# Altium footprint library Connectors.PcbLib: 131 footprints (part 5 of 9)
Each footprint in its own frame and in the unit in brackets; x right, y up, seen from the top. Pads: shape width x height; smd on the part's side, far side on the other; paste and mask are expansions set on the pad; w line width, h text height; cw(c..) or ccw(c..) is an arc to the next point about the centre after c.
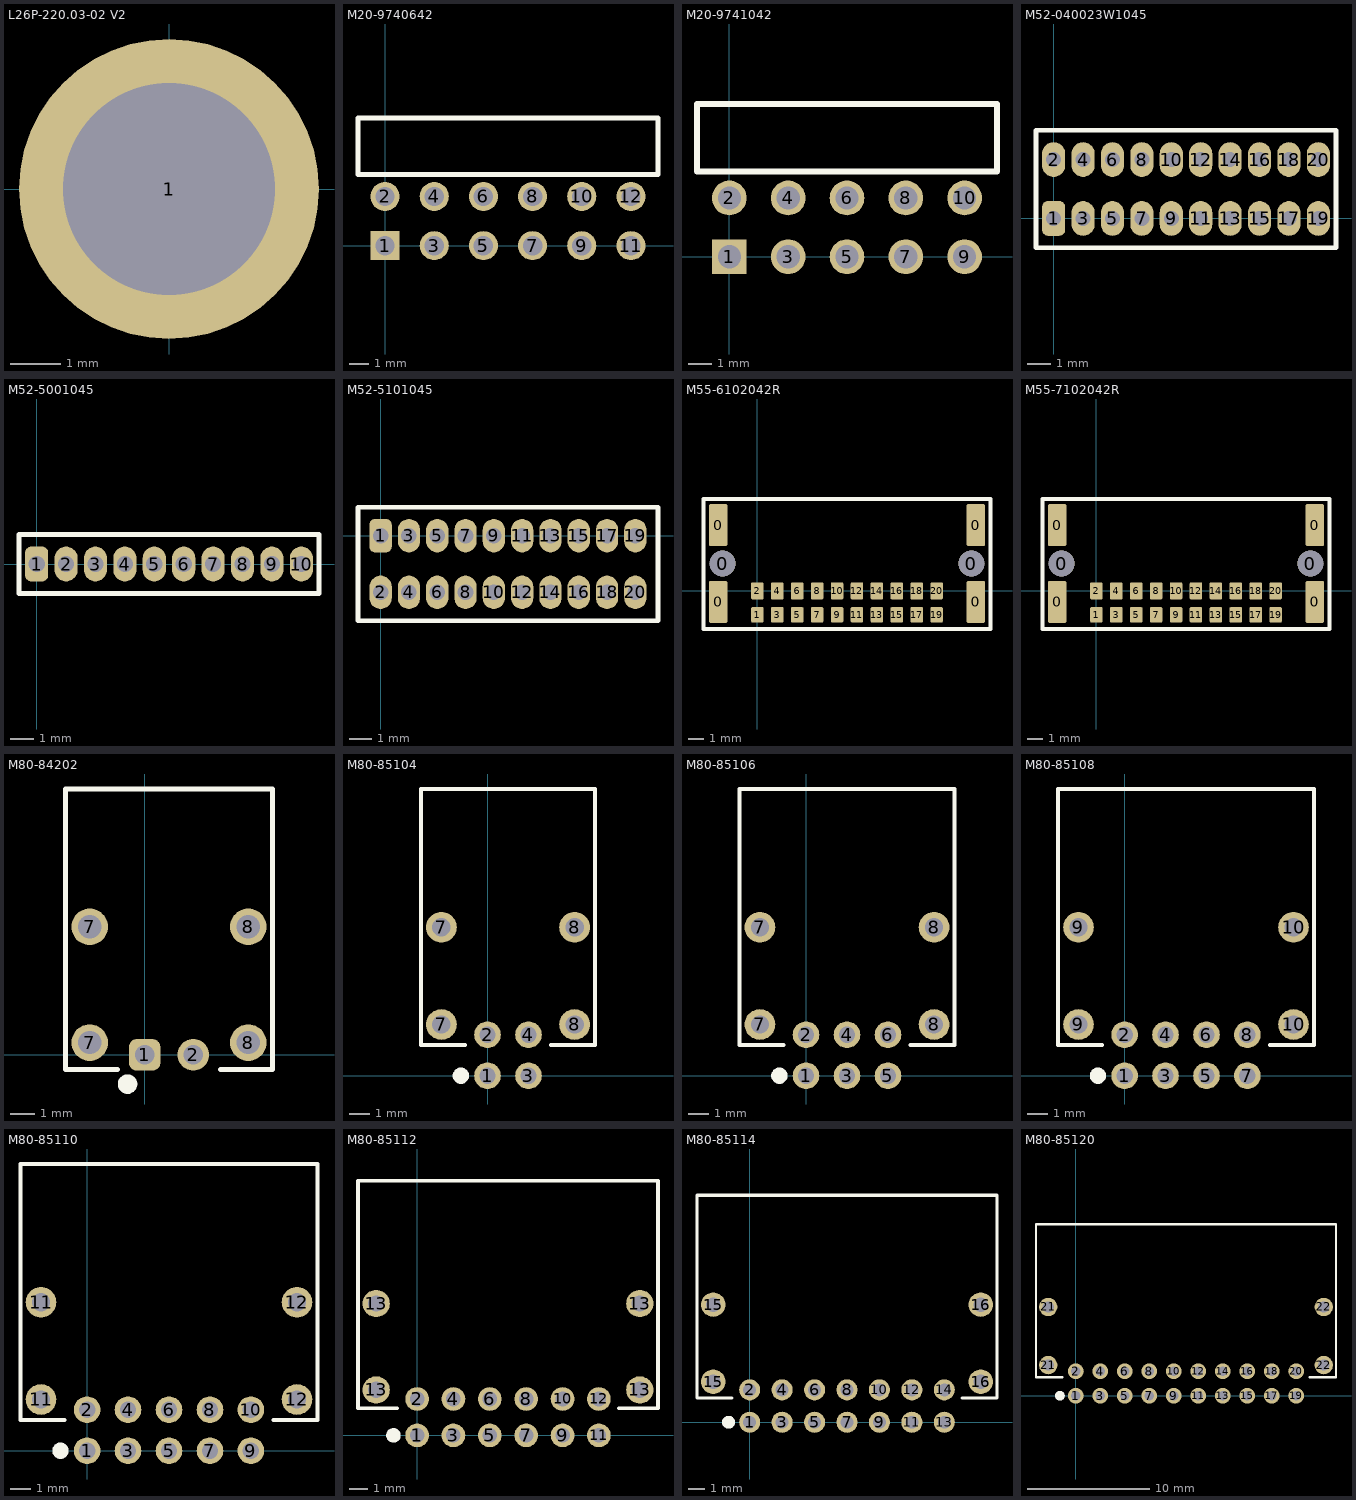
[diagram p4: the footprints below, top view; thin cyan lines are the x and y axes]

## L26P-220.03-02 V2 [mm]
pads (1):
  round 6 hole 4.25: 1(0,0)
Top Assembly:
  text ".Designator" at -4.998,-0.333 h1
3D body "L26P-220.03-02.STEP": height 3.7, standoff -1.3, extent -3,-3 3,3

## M20-9740642 [mm]
pads (12):
  rect 1.5x1.5 hole 1: 1(0,0)
  round 1.5 hole 1: 2(0,2.54) 3(2.54,0) 4(2.54,2.54) 5(5.08,0) 6(5.08,2.54) 7(7.62,0) 8(7.62,2.54) 9(10.16,0) 10(10.16,2.54) 11(12.7,0) 12(12.7,2.54)
Top Overlay:
  lines w0.254: -1.397,3.683 -1.397,6.604 14.097,6.604 14.097,3.683 -1.397,3.683
Top Assembly:
  text ".Designator" at 1.302,4.767 h1
3D body "m20-9740642_asm.stp": height 5.04, standoff -3, extent -1.275,-0.325 13.965,12.235

## M20-9741042 [mm]
pads (10):
  rect 1.5x1.5 hole 1: 1(0,0)
  round 1.5 hole 1: 2(0,2.54) 3(2.54,0) 4(2.54,2.54) 5(5.08,0) 6(5.08,2.54) 7(7.62,0) 8(7.62,2.54) 9(10.16,0) 10(10.16,2.54)
Top Overlay:
  lines w0.254: -1.397,3.683 11.557,3.683 11.557,6.604 -1.397,6.604 -1.397,3.683
Top Assembly:
  text ".Designator" at 0.102,4.867 h1
3D body "m20-9740542_asm.stp": height 5.04, standoff -3, extent -1.275,-0.325 11.425,12.235

## M52-040023W1045 [mm]
pads (20):
  rrect50% 1x1.5 hole 0.65: 1(0,0)
  oval 1x1.5 hole 0.65: 2(0,2.54) 3(1.27,0) 4(1.27,2.54) 5(2.54,0) 6(2.54,2.54) 7(3.81,0) 8(3.81,2.54) 9(5.08,0) 10(5.08,2.54) 11(6.35,0) 12(6.35,2.54) 13(7.62,0) 14(7.62,2.54) 15(8.89,0) 16(8.89,2.54) 17(10.16,0) 18(10.16,2.54) 19(11.43,0) 20(11.43,2.54)
Top Overlay:
  lines w0.203: -0.762,-1.27 -0.762,3.81 12.192,3.81 12.192,-1.27 -0.762,-1.27
Top Assembly:
  text ".Designator" at 0.702,0.967 h1
3D body "m52-040023w1045_asm.stp": height 6.54, standoff -2.26, extent -0.635,-1.25 12.065,3.75

## M52-5001045 [mm]
pads (10):
  rrect50% 1x1.5 hole 0.7: 1(0,0)
  oval 1x1.5 hole 0.7: 2(1.27,0) 3(2.54,0) 4(3.81,0) 5(5.08,0) 6(6.35,0) 7(7.62,0) 8(8.89,0) 9(10.16,0) 10(11.43,0)
Top Overlay:
  lines w0.203: -0.762,-1.27 12.192,-1.27 12.192,1.27 -0.762,1.27 -0.762,-1.27
Top Assembly:
  text ".Designator" at 0.702,-0.333 h1
3D body "m52-5001045_asm.stp": height 4.64, standoff -2.96, extent -0.635,-1.2 12.065,1.2

## M52-5101045 [mm]
pads (20):
  rrect50% 1x1.5 hole 0.7: 1(0,0)
  oval 1x1.5 hole 0.7: 2(0,-2.54) 3(1.27,0) 4(1.27,-2.54) 5(2.54,0) 6(2.54,-2.54) 7(3.81,0) 8(3.81,-2.54) 9(5.08,0) 10(5.08,-2.54) 11(6.35,0) 12(6.35,-2.54) 13(7.62,0) 14(7.62,-2.54) 15(8.89,0) 16(8.89,-2.54) 17(10.16,0) 18(10.16,-2.54) 19(11.43,0) 20(11.43,-2.54)
Top Overlay:
  lines w0.203: -1.016,-3.81 -1.016,1.27 12.446,1.27 12.446,-3.81 -1.016,-3.81
Top Assembly:
  text ".Designator" at 0.702,-1.633 h1
3D body "m52-5101045_asm.stp": height 4.64, standoff -2.96, extent -0.835,-3.77 12.265,1.23

## M55-6102042R [mm]
pads (26):
  rrect25% 1.2x2.7 smd: 0(-2.495,-0.704) 0(-2.495,4.196) 0(13.925,-0.704) 0(13.925,4.196)
  round 1.65 hole 1.65 unplated: 0(-2.21,1.746) 0(13.64,1.746)
  rrect25% 0.8x1 smd: 1(0,-1.524) 3(1.27,-1.524) 5(2.54,-1.524) 7(3.81,-1.524) 9(5.08,-1.524) 11(6.35,-1.524) 13(7.62,-1.524) 15(8.89,-1.524) 17(10.16,-1.524) 19(11.43,-1.524)
  rrect25% 0.8x1.1 smd: 2(0,0) 4(1.27,0) 6(2.54,0) 8(3.81,0) 10(5.08,0) 12(6.35,0) 14(7.62,0) 16(8.89,0) 18(10.16,0) 20(11.43,0)
Top Overlay:
  lines w0.254: -3.429,-2.413 -3.429,5.842 14.859,5.842 14.859,-2.413 -3.429,-2.413
Top Assembly:
  text ".Designator" at 0.702,2.367 h1
3D body "m55-6102042_asm.stp": height 3.74, standoff -0.69, extent -3.175,-1.854 14.605,8.946

## M55-7102042R [mm]
pads (26):
  rrect25% 1.2x2.7 smd: 0(-2.495,-0.704) 0(-2.495,4.196) 0(13.925,-0.704) 0(13.925,4.196)
  round 1.65 hole 1.65 unplated: 0(-2.21,1.746) 0(13.64,1.746)
  rrect25% 0.8x1 smd: 1(0,-1.524) 3(1.27,-1.524) 5(2.54,-1.524) 7(3.81,-1.524) 9(5.08,-1.524) 11(6.35,-1.524) 13(7.62,-1.524) 15(8.89,-1.524) 17(10.16,-1.524) 19(11.43,-1.524)
  rrect25% 0.8x1.1 smd: 2(0,0) 4(1.27,0) 6(2.54,0) 8(3.81,0) 10(5.08,0) 12(6.35,0) 14(7.62,0) 16(8.89,0) 18(10.16,0) 20(11.43,0)
Top Overlay:
  lines w0.254: -3.429,-2.413 14.859,-2.413 14.859,5.842 -3.429,5.842 -3.429,-2.413
Top Assembly:
  text ".Designator" at 0.702,2.567 h1
3D body "m55-7102042_asm.stp": height 4.25, standoff -0.7, extent -3.175,-1.85 14.605,8.15

## M80-84202 [mm]
pads (6):
  rrect50% 1.3x1.3 hole 0.8: 1(0,0)
  round 1.3 hole 0.8: 2(2,0)
  round 1.5 hole 0.95: 7(-2.25,0.5) 7(-2.25,5.25) 8(4.25,0.5) 8(4.25,5.25)
Top Overlay:
  circle w0.4: c-0.7,-1.2 r0.2
  lines w0.2: -1.1,-0.6 -3.25,-0.6 -3.25,10.9 5.25,10.9 5.25,-0.6 3.1,-0.6
Top Assembly:
  text ".Designator" at -3.998,2.192 h1
3D body "M80-8450245.stp": height 3.8, standoff 0.4, extent -2.5,2.95 4.5,10.6
3D body "M80-8420245.stp": height 3.88, standoff -2.97, extent -2.95,-0.1 4.95,9

## M80-85104 [mm]
pads (8):
  round 1.3 hole 0.8: 1(0,0) 2(0,2) 3(2,0) 4(2,2)
  round 1.5 hole 0.9: 7(-2.25,2.5) 7(-2.25,7.25) 8(4.25,2.5) 8(4.25,7.25)
Top Overlay:
  circle w0.4: c-1.3,0 r0.2
  lines w0.2: -1.1,1.5 -3.25,1.5 -3.25,14 5.25,14 5.25,1.5 3.1,1.5
Top Assembly:
  text ".Designator" at -3.998,4.467 h1
3D body "m80-8510442_asm.stp": height 5.87, standoff -3.17, extent -2.95,-0.275 4.95,10.825

## M80-85106 [mm]
pads (10):
  round 1.3 hole 0.8: 1(0,0) 2(0,2) 3(2,0) 4(2,2) 5(4,0) 6(4,2)
  round 1.5 hole 0.9: 7(-2.25,2.5) 7(-2.25,7.25) 8(6.25,2.5) 8(6.25,7.25)
Top Overlay:
  circle w0.4: c-1.3,0 r0.2
  lines w0.2: -1.1,1.5 -3.25,1.5 -3.25,14 7.25,14 7.25,1.5 5.1,1.5
Top Assembly:
  text ".Designator" at -2.998,4.467 h1
3D body "m80-8510642_asm.stp": height 5.87, standoff -3.17, extent -2.95,-0.25 6.95,10.85

## M80-85108 [mm]
pads (12):
  round 1.3 hole 0.8: 1(0,0) 2(0,2) 3(2,0) 4(2,2) 5(4,0) 6(4,2) 7(6,0) 8(6,2)
  round 1.5 hole 0.9: 9(-2.25,2.5) 9(-2.25,7.25) 10(8.25,2.5) 10(8.25,7.25)
Top Overlay:
  circle w0.4: c-1.3,0 r0.2
  lines w0.2: -1.1,1.5 -3.25,1.5 -3.25,14 9.25,14 9.25,1.5 7.1,1.5
Top Assembly:
  text ".Designator" at -1.998,4.667 h1
3D body "m80-8510842_asm.stp": height 5.77, standoff -3.27, extent -2.95,-0.25 8.95,10.85

## M80-85110 [mm]
pads (14):
  round 1.3 hole 0.8: 1(0,0) 2(0,2) 3(2,0) 4(2,2) 5(4,0) 6(4,2) 7(6,0) 8(6,2) 9(8,0) 10(8,2)
  round 1.5 hole 0.9: 11(-2.25,2.5) 11(-2.25,7.25) 12(10.25,2.5) 12(10.25,7.25)
Top Overlay:
  circle w0.4: c-1.3,0 r0.2
  lines w0.2: -1.1,1.5 -3.25,1.5 -3.25,14 11.25,14 11.25,1.5 9.1,1.5
Top Assembly:
  text ".Designator" at -0.998,4.667 h1
3D body "m80-8511042_asm.stp": height 5.87, standoff -3.17, extent -2.95,-0.25 10.95,10.85

## M80-85112 [mm]
pads (16):
  round 1.3 hole 0.8: 1(0,0) 2(0,2) 3(2,0) 4(2,2) 5(4,0) 6(4,2) 7(6,0) 8(6,2) 9(8,0) 10(8,2) 11(10,0) 12(10,2)
  round 1.5 hole 0.9: 13(-2.25,2.5) 13(-2.25,7.25) 13(12.25,2.5) 13(12.25,7.25)
Top Overlay:
  circle w0.4: c-1.3,0 r0.2
  lines w0.2: -1.1,1.5 -3.25,1.5 -3.25,14 13.25,14 13.25,1.5 11.1,1.5
Top Assembly:
  text ".Designator" at 0.002,4.667 h1
3D body "m80-85112xx_asm.stp": height 5.98, standoff -3.07, extent -2.95,-0.25 12.95,10.85

## M80-85114 [mm]
pads (18):
  round 1.3 hole 0.8: 1(0,0) 2(0,2) 3(2,0) 4(2,2) 5(4,0) 6(4,2) 7(6,0) 8(6,2) 9(8,0) 10(8,2) 11(10,0) 12(10,2) 13(12,0) 14(12,2)
  round 1.5 hole 0.9: 15(-2.25,2.5) 15(-2.25,7.25) 16(14.25,2.5) 16(14.25,7.25)
Top Overlay:
  circle w0.4: c-1.3,0 r0.2
  lines w0.2: -1.1,1.5 -3.25,1.5 -3.25,14 15.25,14 15.25,1.5 13.1,1.5
Top Assembly:
  text ".Designator" at 1.002,4.667 h1
3D body "m80-8511442_asm.stp": height 5.87, standoff -3.17, extent -2.95,-0.275 14.95,10.825

## M80-85120 [mm]
pads (24):
  round 1.3 hole 0.8: 1(0,0) 2(0,2) 3(2,0) 4(2,2) 5(4,0) 6(4,2) 7(6,0) 8(6,2) 9(8,0) 10(8,2) 11(10,0) 12(10,2) 13(12,0) 14(12,2) 15(14,0) 16(14,2) 17(16,0) 18(16,2) 19(18,0) 20(18,2)
  round 1.5 hole 0.9: 21(-2.25,2.5) 21(-2.25,7.25) 22(20.25,2.5) 22(20.25,7.25)
Top Overlay:
  circle w0.4: c-1.3,0 r0.2
  lines w0.2: -1.1,1.5 -3.25,1.5 -3.25,14 21.25,14 21.25,1.5 19.1,1.5
Top Assembly:
  text ".Designator" at 4.002,4.667 h1
3D body "m80-85120xx_asm.stp": height 5.98, standoff -3.07, extent -2.95,-0.25 20.95,10.85